# Altium footprint library Resistors.PcbLib: 93 footprints (part 4 of 6)
Each footprint in its own frame and in the unit in brackets; x right, y up, seen from the top. Pads: shape width x height; smd on the part's side, far side on the other; paste and mask are expansions set on the pad; w line width, h text height; cw(c..) or ccw(c..) is an arc to the next point about the centre after c.
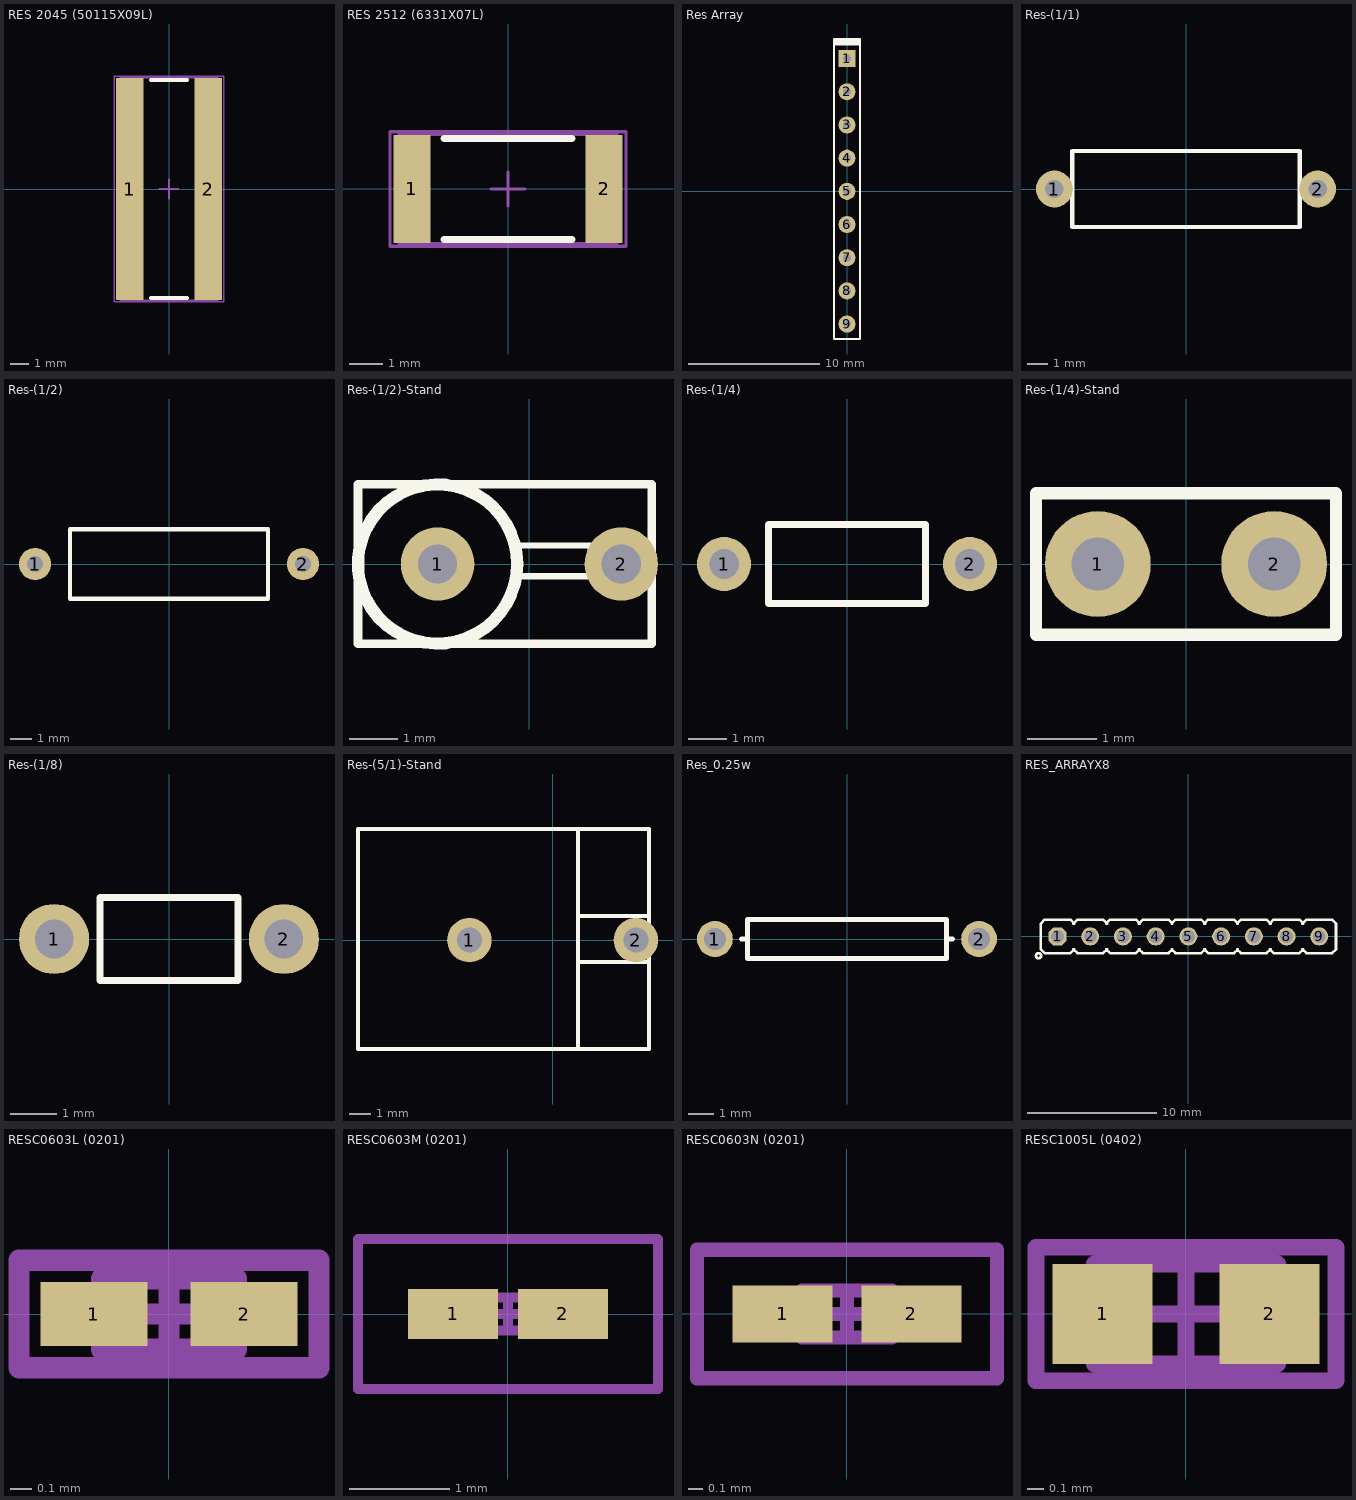
[diagram p3: the footprints below, top view; thin cyan lines are the x and y axes]

## RES 2045 (50115X09L) [mm] "Chip Resistor, 2-Leads, Body 5.0x11.5mm, IPC High Density _ (1.0 W)"
height 0.9
pads (2):
  rect 1.45x11.75 smd: 1(-2.075,0) 2(2.075,0)
Top Overlay:
  lines w0.2: -0.95,-5.775 0.95,-5.775 ; -0.95,5.775 0.95,5.775
Mechanical 13:
  lines w0.1: -2.575,-5.9 2.575,-5.9 2.575,5.9 -2.575,5.9 -2.575,-5.9
Mechanical 15:
  lines w0.1: -0.5,0 0.5,0 ; 0,-0.5 0,0.5 ; -2.9,-5.975 2.9,-5.975 2.9,5.975 -2.9,5.975 -2.9,-5.975
3D body "2045.STEP": height 0.9, standoff 0, extent -2.54,-5.715 2.54,5.715

## RES 2512 (6331X07L) [mm] "Chip Resistor, 2-Leads, Body 6.3x3.1mm, IPC High Density _ (0.500 W)"
height 0.7
pads (2):
  rect 1.1x3.2 smd: 1(-2.85,0) 2(2.85,0)
Top Overlay:
  lines w0.2: -1.9,-1.5 1.9,-1.5 ; -1.9,1.5 1.9,1.5
Mechanical 13:
  lines w0.1: -3.225,-1.625 3.225,-1.625 3.225,1.625 -3.225,1.625 -3.225,-1.625
Mechanical 15:
  lines w0.1: -0.5,0 0.5,0 ; 0,-0.5 0,0.5 ; -3.5,-1.7 3.5,-1.7 3.5,1.7 -3.5,1.7 -3.5,-1.7
3D body "2512.STEP": height 0.6, standoff 0, extent -3.175,-1.524 3.175,1.524

## Res Array [mm]
pads (9):
  rect 1.3x1.3 hole 0.6: 1(0,10.16)
  round 1.3 hole 0.6: 2(0,7.62) 3(0,5.08) 4(0,2.54) 5(0,0) 6(0,-2.54) 7(0,-5.08) 8(0,-7.62) 9(0,-10.16)
Top Overlay:
  rectangle: -1,11.16 1,11.66
  lines w0.178: -1,-11.303 1,-11.303 1,11.66 -1,11.66 -1,-11.303
3D body "SW3dPS-80015102.step": height 5.4, standoff -3.1, extent -0.625,-11.215 0.625,11.285

## Res-(1/1) [mil]
pads (2):
  round 70 hole 35: 1(-250,0) 2(250,0)
Top Overlay:
  lines w7.87: -216,-72 -216,72 216,72 216,-72 -216,-72
3D body "Res_Normal (1W).STEP": height 150.74, standoff -78.74, extent -260.5,-71 264.5,73

## Res-(1/2) [mil]
pads (2):
  round 60 hole 30: 1(-250,0) 2(250,0)
Top Overlay:
  lines w7.87: -185,-65 185,-65 185,65 -185,65 -185,-65
3D body: height 82.5, standoff 57.5, extent 237.5,-12.5 262.5,12.5
3D body: height 70, standoff -80, extent 237.5,-12.5 262.5,12.5
3D body: height 82.5, standoff 57.5, extent -262.5,-12.5 -237.5,12.5
3D body: height 70, standoff -80, extent -262.5,-12.5 -237.5,12.5
3D body: height 135, standoff 5, extent -185,-65.13 185,64.87
3D body: height 82.5, standoff 57.5, extent -250,-12.5 250,12.5
3D body: height 136, standoff 4, extent -150,-66.13 -120,65.87
3D body: height 136, standoff 4, extent -87.5,-66.13 -57.5,65.87
3D body: height 136, standoff 4, extent -25,-66.13 5,65.87
3D body: height 136, standoff 4, extent 115,-66.13 145,65.87

## Res-(1/2)-Stand [mil]
pads (2):
  round 60 hole 32: 1(-75,0) 2(75,0)
Top Overlay:
  circle w10: c-75,0 r65
  lines w5: -10,-10 50,-10 50,15 -10,15
  lines w7: -140,-65 -140,65 100,65 100,-65 -140,-65
3D body: height 420, standoff -80, extent 62.01,-13 88.01,13
3D body: height 433, standoff 407, extent -88,-13 -62,13
3D body: height 433, standoff 407, extent 62,-13 88,13
3D body: height 420, standoff -80, extent -88,-13 -62,13
3D body: height 350, standoff 320, extent -141,-66 -9,66
3D body: height 380, standoff 20, extent -140,-65 -10,65
3D body: height 433, standoff 407, extent -75,-13 75,13
3D body: height 80, standoff 50, extent -141,-66 -9,66
3D body: height 130, standoff 100, extent -141,-66 -9,66
3D body: height 180, standoff 150, extent -141,-66 -9,66

## Res-(1/4) [mil]
pads (2):
  round 55 hole 30: 1(-125,0) 2(125,0)
Top Overlay:
  lines w7.09: -80,-40 80,-40 80,40 -80,40 -80,-40
3D body "Res_Normal (0.25W).STEP": height 115.05, standoff -39.37, extent -135,-36.21 135,35.74

## Res-(1/4)-Stand [mil]
pads (2):
  round 60 hole 30: 1(-50,0) 2(50,0)
Top Overlay:
  lines w7: -85,-40 -85,40 85,40 85,-40 -85,-40
3D body "Res 0.25W_Stand.STEP": height 287.32, standoff -57.17, extent -75.68,-35.97 70.47,35.97

## Res-(1/8) [mil]
pads (2):
  round 60 hole 33: 1(-98.43,0) 2(98.43,0)
Top Overlay:
  lines w5.91: -59.06,-35.43 -59.06,35.43 59.06,35.43 59.06,-35.43 -59.06,-35.43
3D body "Res_18.STEP": height 77.04, standoff -32.9, extent -108.27,-32.06 108.27,29.7

## Res-(5/1)-Stand [mil]
pads (2):
  round 80 hole 45: 1(-150,0) 2(150,0)
Top Overlay:
  lines w7: 45.69,-196 45.69,200 ; 45.69,-39.37 174,-39.37 ; 45.69,43.31 174,43.31 ; -350.79,-196 174,-196 174,200 -350.79,200 -350.79,-196
3D body "5W Res.STEP": height 917.48, standoff -84.49, extent -345.48,-194 169.48,199.7

## Res_0.25w [mm]
pads (2):
  round 1.4 hole 0.85: 1(-5.155,0) 2(5.15,0)
Top Overlay:
  lines w0.2: -4.114,0 -3.885,0 ; 4.109,0 3.88,0 ; 3.88,0 3.88,-0.762 -3.885,-0.762 -3.885,0.762 3.88,0.762 3.88,0
3D body "Resistor_0.25W.STEP": height 2.93, standoff -2.54, extent -5.46,-1.156 5.31,1.156

## RES_ARRAYX8 [mm]
pads (9):
  oct 1.4x1.4 / inner oct 1.4x1.4 / far side oct 1.4x2.2 hole 1 mask+0.1: 1(-10.16,0)
  round 1.4 / inner round 1.4 / far side oval 1.4x2.2 hole 1 mask+0.1: 2(-7.62,0) 3(-5.08,0) 4(-2.54,0) 5(0,0) 6(2.54,0) 7(5.08,0) 8(7.62,0) 9(10.16,0)
Top Overlay:
  circle w0.2: c-11.63,-1.5 r0.2
  lines w0.2: -8.92,-1 -8.62,-1.3 -6.62,-1.3 -6.32,-1 ; -8.92,1 -8.62,1.3 -6.62,1.3 -6.32,1 ; -8.86,-1 -9.16,-1.3 -11.16,-1.3 -11.46,-1 -11.46,1 -11.16,1.3 -9.16,1.3 -8.86,1 ; -6.38,-1 -6.08,-1.3 -4.08,-1.3 -3.78,-1 ; -6.38,1 -6.08,1.3 -4.08,1.3 -3.78,1 ; -3.84,-1 -3.54,-1.3 -1.54,-1.3 -1.24,-1 ; -3.84,1 -3.54,1.3 -1.54,1.3 -1.24,1 ; -1.3,-1 -1,-1.3 1,-1.3 1.3,-1 ; -1.3,1 -1,1.3 1,1.3 1.3,1 ; 1.24,-1 1.54,-1.3 3.54,-1.3 3.84,-1 ; 1.24,1 1.54,1.3 3.54,1.3 3.84,1 ; 3.78,-1 4.08,-1.3 6.08,-1.3 6.38,-1 ; 3.78,1 4.08,1.3 6.08,1.3 6.38,1 ; 6.32,-1 6.62,-1.3 8.62,-1.3 8.92,-1 ; 6.32,1 6.62,1.3 8.62,1.3 8.92,1 ; 8.86,-1 9.16,-1.3 11.16,-1.3 11.46,-1 11.46,1 11.16,1.3 9.16,1.3 8.86,1
3D body "User Library-Resistor Pack 8.STEP": height 6.43, standoff -2, extent -11.405,-1.3 11.405,1.2

## RESC0603L (0201) [mm] "Chip Resistor, Body 0.6x0.3mm, IPC High Density"
height 0.3
pads (2):
  rect 0.5x0.3 smd: 1(-0.35,0) 2(0.35,0)
Mechanical 13:
  lines w0.1: -0.315,-0.165 -0.315,0.165 0.315,0.165 0.315,-0.165 -0.315,-0.165
Mechanical 15:
  lines w0.1: -0.165,0 0.165,0 ; 0,-0.165 0,0.165 ; -0.7,-0.25 -0.7,0.25 0.7,0.25 0.7,-0.25 -0.7,-0.25
3D body "RESC0603X28N.STEP": height 0.28, standoff 0, extent -0.3,-0.15 0.3,0.15

## RESC0603M (0201) [mm] "Chip Resistor, Body 0.6x0.3mm, IPC Low Density"
height 0.3
pads (2):
  rect 0.9x0.5 smd: 1(-0.55,0) 2(0.55,0)
Mechanical 13:
  lines w0.1: -0.315,-0.165 -0.315,0.165 0.315,0.165 0.315,-0.165 -0.315,-0.165
Mechanical 15:
  lines w0.1: -0.165,0 0.165,0 ; 0,-0.165 0,0.165 ; -1.5,-0.75 -1.5,0.75 1.5,0.75 1.5,-0.75 -1.5,-0.75
3D body "RESC0603X28N.STEP": height 0.28, standoff 0, extent -0.3,-0.15 0.3,0.15

## RESC0603N (0201) [mm] "Chip Resistor, Body 0.6x0.3mm, IPC Medium Density"
height 0.3
pads (2):
  rect 0.7x0.4 smd: 1(-0.45,0) 2(0.45,0)
Mechanical 13:
  lines w0.1: -0.315,-0.165 -0.315,0.165 0.315,0.165 0.315,-0.165 -0.315,-0.165
Mechanical 15:
  lines w0.1: -0.165,0 0.165,0 ; 0,-0.165 0,0.165 ; -1.05,-0.45 -1.05,0.45 1.05,0.45 1.05,-0.45 -1.05,-0.45
3D body "RESC0603X28N.STEP": height 0.28, standoff 0, extent -0.3,-0.15 0.3,0.15

## RESC1005L (0402) [mm] "Chip Resistor, Body 1.1x0.5mm, IPC High Density"
height 0.4
pads (2):
  rect 0.6x0.6 smd: 1(-0.5,0) 2(0.5,0)
Mechanical 13:
  lines w0.1: -0.55,-0.3 -0.55,0.3 0.55,0.3 0.55,-0.3 -0.55,-0.3
Mechanical 15:
  lines w0.1: -0.3,0 0.3,0 ; 0,-0.3 0,0.3 ; -0.9,-0.4 -0.9,0.4 0.9,0.4 0.9,-0.4 -0.9,-0.4
3D body "0402.STEP": height 0.35, standoff 0, extent -0.508,-0.254 0.508,0.254